# Altium footprint library VESC_MotorController.PcbLib: 78 footprints (part 5 of 5)
Each footprint in its own frame and in the unit in brackets; x right, y up, seen from the top. Pads: shape width x height; smd on the part's side, far side on the other; paste and mask are expansions set on the pad; w line width, h text height; cw(c..) or ccw(c..) is an arc to the next point about the centre after c.
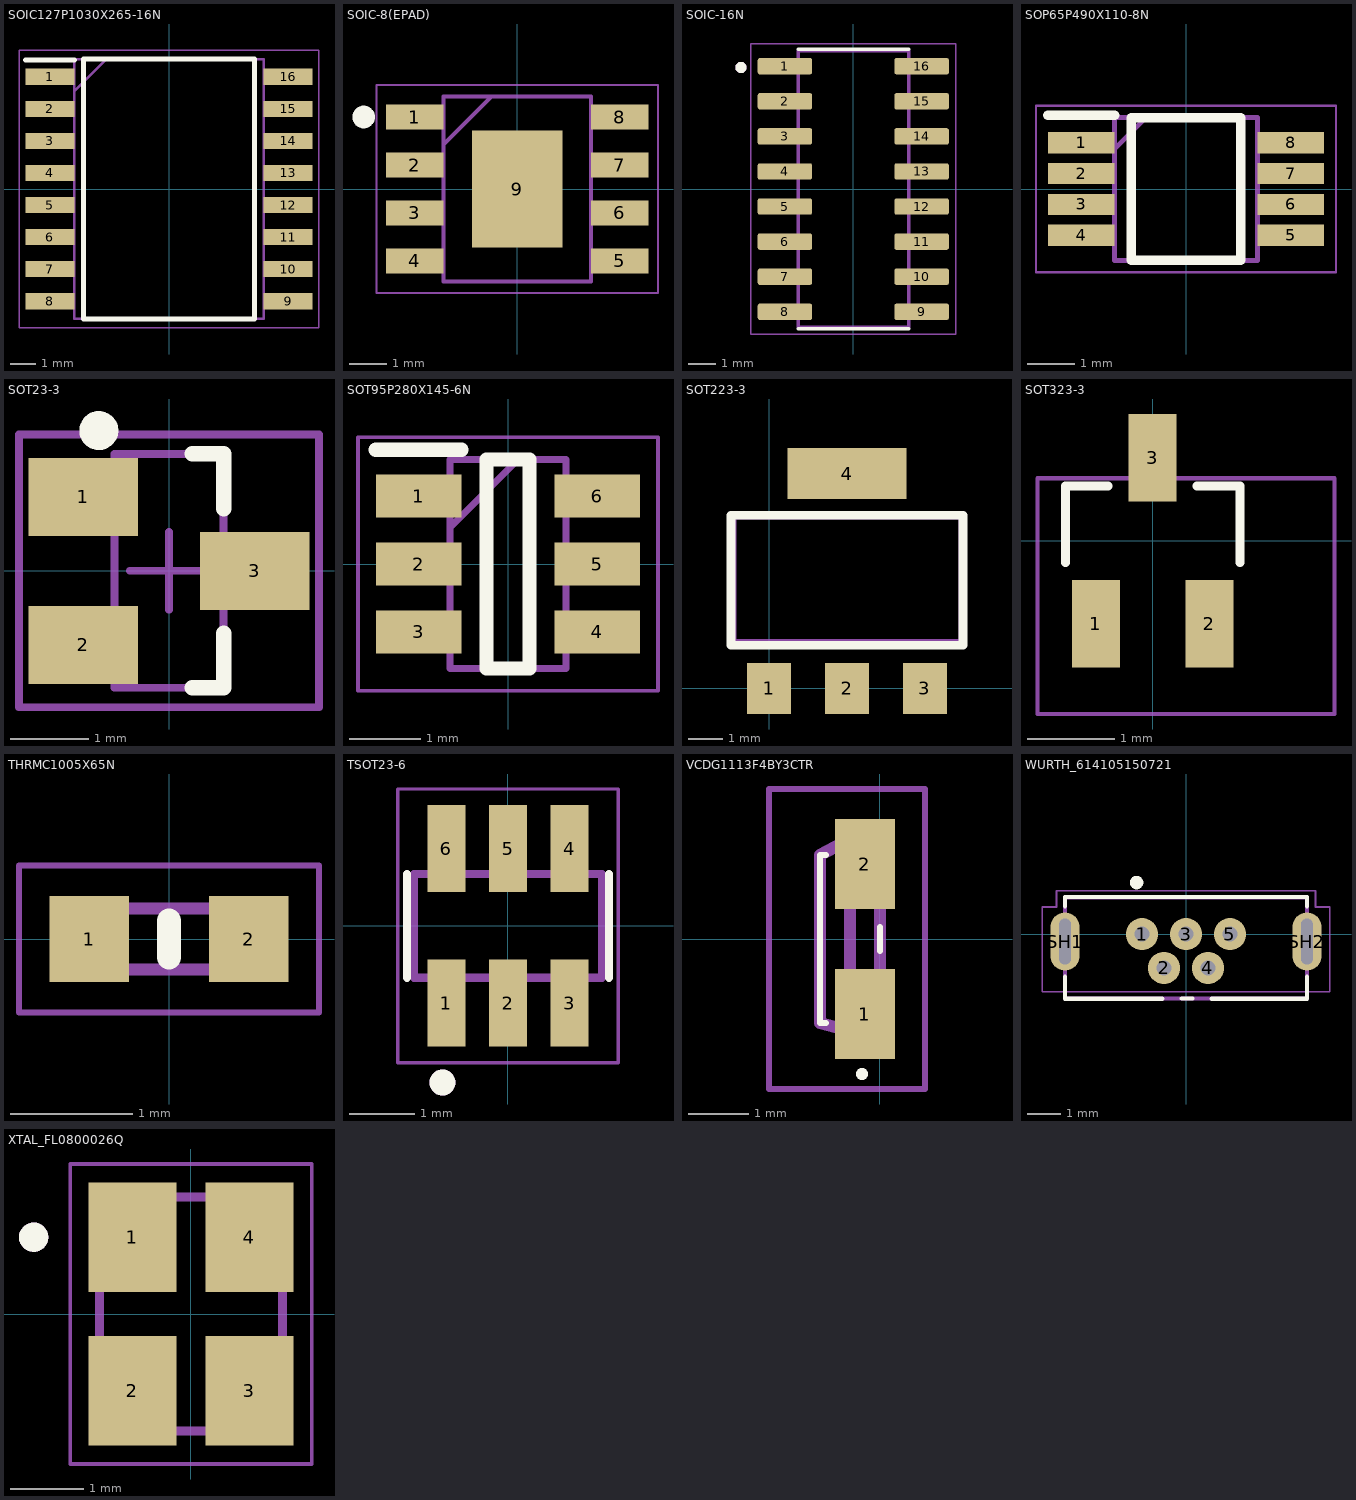
[diagram p4: the footprints below, top view; thin cyan lines are the x and y axes]

## SOIC127P1030X265-16N [mm]
pads (16):
  rect 1.95x0.65 smd: 1(-4.725,4.445) 2(-4.725,3.175) 3(-4.725,1.905) 4(-4.725,0.635) 5(-4.725,-0.635) 6(-4.725,-1.905) 7(-4.725,-3.175) 8(-4.725,-4.445) 9(4.725,-4.445) 10(4.725,-3.175) 11(4.725,-1.905) 12(4.725,-0.635) 13(4.725,0.635) 14(4.725,1.905) 15(4.725,3.175) 16(4.725,4.445)
Top Overlay:
  lines w0.2: -5.7,5.12 -3.75,5.12 ; -3.4,-5.15 3.4,-5.15 3.4,5.15 -3.4,5.15 -3.4,-5.15
Mechanical 15:
  lines w0.1: -3.75,3.88 -2.48,5.15 ; -3.75,-5.15 3.75,-5.15 3.75,5.15 -3.75,5.15 -3.75,-5.15
Mechanical 20:
  lines w0.05: -5.95,-5.5 5.95,-5.5 5.95,5.5 -5.95,5.5 -5.95,-5.5
3D body "UCC21520ADW.stp": height 2.59, standoff 0, extent -5.167,-5.15 5.167,5.15

## SOIC-8(EPAD) [mm]
height 17.75
pads (9):
  rect 1.525x0.65 smd: 1(-2.712,1.905) 2(-2.712,0.635) 3(-2.712,-0.635) 4(-2.712,-1.905) 5(2.712,-1.905) 6(2.712,-0.635) 7(2.712,0.635) 8(2.712,1.905)
  rect 2.4x3.1 smd: 9(0,0)
Top Overlay:
  circle w0.3: c-4.064,1.905 r0.15
Mechanical 15:
  lines w0.1: -1.95,1.18 -0.68,2.45 ; -1.95,-2.45 1.95,-2.45 1.95,2.45 -1.95,2.45 -1.95,-2.45
Mechanical 16:
  lines w0.05: -3.725,-2.75 3.725,-2.75 3.725,2.75 -3.725,2.75 -3.725,-2.75
3D body "LM5164DDAR.stp": height 1.57, standoff 0, extent -3,-2.45 3,2.45

## SOIC-16N [mm]
pads (16):
  rrect25% 1.97x0.59 smd: 1(-2.475,4.445) 2(-2.475,3.175) 3(-2.475,1.905) 4(-2.475,0.635) 5(-2.475,-0.635) 6(-2.475,-1.905) 7(-2.475,-3.175) 8(-2.475,-4.445) 9(2.475,-4.445) 10(2.475,-3.175) 11(2.475,-1.905) 12(2.475,-0.635) 13(2.475,0.635) 14(2.475,1.905) 15(2.475,3.175) 16(2.475,4.445)
Top Overlay:
  circle w0.2: c-4.064,4.4 r0.1
  lines w0.127: -2,-5.06 2,-5.06 ; -2,5.06 2,5.06
Mechanical 13:
  circle w0.2: c-4.064,4.4 r0.1
  lines w0.127: -2,-5 -2,5 2,5 2,-5 -2,-5
Mechanical 15:
  lines w0.05: -3.71,-5.25 -3.71,5.25 3.71,5.25 3.71,-5.25 -3.71,-5.25
3D body "STGAP2DMTR.STEP": height 1.75, standoff 0, extent -3,-4.95 3,4.95

## SON65P300X300X80-9N [mm]
3D body "NTMTSC002N10MCTXG.stp": height 1.02, standoff 0, extent -4.15,-4.2 4.15,4.2

## SOP65P490X110-8N [mm]
pads (8):
  rect 1.4x0.45 smd: 1(-2.2,0.975) 2(-2.2,0.325) 3(-2.2,-0.325) 4(-2.2,-0.975) 5(2.2,-0.975) 6(2.2,-0.325) 7(2.2,0.325) 8(2.2,0.975)
Top Overlay:
  lines w0.2: -2.9,1.55 -1.5,1.55 ; -1.15,-1.5 1.15,-1.5 1.15,1.5 -1.15,1.5 -1.15,-1.5
Mechanical 15:
  lines w0.1: -1.5,0.85 -0.85,1.5 ; -1.5,-1.5 1.5,-1.5 1.5,1.5 -1.5,1.5 -1.5,-1.5
Mechanical 20:
  lines w0.05: -3.15,-1.75 3.15,-1.75 3.15,1.75 -3.15,1.75 -3.15,-1.75
3D body "MCP16311T-E_MS.stp": height 1.1, standoff 0, extent -2.45,-1.5 2.45,1.5

## SOT23-3 [mm] "SOT23 semtech SM712"
height 1
pads (3):
  rect 1.4x1 smd: 1(-1.1,0.95) 2(-1.1,-0.95) 3(1.1,0)
Top Overlay:
  circle w0.25: c-0.9,1.8 r0.125
  lines w0.2: 0.3,-1.5 0.7,-1.5 0.7,-0.8 ; 0.3,1.5 0.7,1.5 0.7,0.8
Mechanical 13:
  lines w0.1: -0.7,-1.5 -0.7,1.5 0.7,1.5 0.7,-1.5 -0.7,-1.5
Mechanical 15:
  lines w0.1: -0.5,0 0.5,0 ; 0,-0.5 0,0.5 ; -1.925,-1.75 -1.925,1.75 1.925,1.75 1.925,-1.75 -1.925,-1.75
3D body: height 0.2, standoff 0, extent -1.422,0.711 -1.067,1.219
3D body: height 0.2, standoff 0, extent -1.473,-1.219 -1.067,-0.711
3D body: height 0.2, standoff 0, extent 1.067,-0.254 1.473,0.254
3D body: height 0.55, standoff 0, extent -1.067,0.711 -0.864,1.219
3D body: height 0.55, standoff 0, extent -1.067,-1.219 -0.864,-0.711
3D body: height 0.55, standoff 0, extent 0.864,-0.254 1.067,0.254
3D body: height 0.55, standoff 0.35, extent 0.66,-0.254 0.864,0.254
3D body: height 0.55, standoff 0.35, extent -0.864,-1.219 -0.66,-0.711
3D body: height 0.55, standoff 0.35, extent -0.864,0.711 -0.61,1.219
3D body: height 1.1, standoff 0.1, extent -0.7,-1.5 0.7,1.5

## SOT95P280X145-6N [mm]
pads (6):
  rect 1.2x0.6 smd: 1(-1.25,0.95) 2(-1.25,0) 3(-1.25,-0.95) 4(1.25,-0.95) 5(1.25,0) 6(1.25,0.95)
Top Overlay:
  lines w0.2: -1.85,1.6 -0.65,1.6 ; -0.3,-1.462 0.3,-1.462 0.3,1.462 -0.3,1.462 -0.3,-1.462
Mechanical 15:
  lines w0.1: -0.812,0.512 0.138,1.462 ; -0.812,-1.462 0.812,-1.462 0.812,1.462 -0.812,1.462 -0.812,-1.462
Mechanical 20:
  lines w0.05: -2.1,-1.775 2.1,-1.775 2.1,1.775 -2.1,1.775 -2.1,-1.775
3D body "USBLC6-2SC6Y.stp": height 1.45, standoff 0, extent -1.4,-1.462 1.4,1.462

## SOT223-3 [mm]
height 2
pads (4):
  rect 1.3x1.5 smd: 1(0,0) 2(2.286,0) 3(4.572,0)
  rect 3.5x1.5 smd: 4(2.286,6.299)
Top Overlay:
  lines w0.254: -1.116,1.27 5.688,1.27 5.688,5.08 -1.116,5.08 -1.116,1.27
Mechanical 1:
  lines w0.2: -1.05,1.35 5.65,1.35 5.65,5.05 -1.05,5.05 -1.05,1.35
3D body "SW3dPS-sot-223.step": height 1.64, standoff -0.04, extent -1,-0.3 5.5,6.632

## SOT323-3 [mm]
pads (3):
  rect 0.55x1 smd: 1(-0.65,-0.95) 2(0.65,-0.95) 3(0,0.95)
Top Overlay:
  lines w0.1: -1,-0.254 -1,0.625 -0.508,0.625 ; 0.508,0.625 1,0.625 1,-0.254
Mechanical 20:
  lines w0.05: -1.319,-1.985 2.081,-1.985 2.081,0.715 -1.319,0.715 -1.319,-1.985
3D body "BSS138PW,115.stp": height 0.93, standoff -0.02, extent -1.084,-1.05 1.016,1.05

## THRMC1005X65N [mm]
pads (2):
  rect 0.65x0.7 smd: 1(-0.65,0) 2(0.65,0)
Top Overlay:
  lines w0.2: 0,-0.15 0,0.15
Mechanical 15:
  lines w0.1: -0.5,-0.25 -0.5,0.25 0.5,0.25 0.5,-0.25 -0.5,-0.25
Mechanical 20:
  lines w0.05: -1.225,-0.6 -1.225,0.6 1.225,0.6 1.225,-0.6 -1.225,-0.6
3D body "NTCS0402E3103GL1T.stp": height 0.65, standoff 0, extent -0.5,-0.25 0.5,0.25

## TSOT23-6 [mm] "SOT23 semtech SM712"
height 1
pads (6):
  rect 0.59x1.34 smd: 1(-0.95,-1.19) 2(0,-1.19) 3(0.95,-1.19) 4(0.95,1.19) 5(0,1.19) 6(-0.95,1.19)
Top Overlay:
  circle w0.2: c-1.011,-2.416 r0.1
  lines w0.127: -1.558,-0.8 -1.558,0.8 ; 1.559,-0.8 1.559,0.8
Mechanical 13:
  circle w0.2: c-1.011,-2.416 r0.1
  lines w0.127: -1.45,-0.8 -1.45,0.8 1.45,0.8 1.45,-0.8 -1.45,-0.8
Mechanical 15:
  lines w0.05: -1.7,-2.11 -1.7,2.11 1.7,2.11 1.7,-2.11 -1.7,-2.11
3D body "step_temp.STEP": height 1, standoff 0, extent -1.45,-1.4 1.45,1.4

## VCDG1113F4BY3CTR [mm]
pads (2):
  rect 1x1.5 smd: 1(-0.25,-1.25) 2(-0.25,1.25)
Top Overlay:
  lines w0.1: -0.9,-1.4 -1,-1.4 -1,1.4 -0.9,1.4 ; 0,-0.2 0,0.2 ; -0.3,-2.3 ccw(c-0.3,-2.25) -0.3,-2.2 ccw(c-0.3,-2.25) -0.3,-2.3
Mechanical 15:
  lines w0.2: -0.25,-1.6 -1,-1.4 -1,1.4 -0.25,1.8 ; -0.5,-1.05 -0.5,1.05 0,1.05 0,-1.05 -0.5,-1.05 ; -0.5,-0.85 -0.5,0.85 -0.5,-0.85
Mechanical 20:
  lines w0.1: -1.85,-2.5 -1.85,2.5 0.75,2.5 0.75,-2.5 -1.85,-2.5
3D body "VCDG1113F-4BY3C-TR.stp": height 0.95, standoff -0.05, extent -0.6,-1.05 0,1.05

## WURTH_614105150721 [mm]
pads (7):
  round 0.948 hole 0.44: 1(-1.3,0) 2(-0.65,-1) 3(0,0) 4(0.65,-1) 5(1.3,0)
  oval 0.858x1.716 hole 0.35 slot 1.35 at 90 deg: SH1(-3.575,-0.22) SH2(3.575,-0.22)
Top Overlay:
  circle w0.2: c-1.46,1.524 r0.1
  lines w0.127: -3.575,-1.26 -3.575,-1.911 -0.699,-1.911 ; -3.575,0.82 -3.575,1.095 3.575,1.095 3.575,0.82 ; -0.127,-1.905 0.193,-1.905 ; 0.762,-1.912 3.575,-1.912 3.575,-1.26
Mechanical 13:
  circle w0.2: c-1.3,0 r0.1
  lines w0.127: -3.575,-1.905 -3.575,1.079 3.575,1.079 3.575,-1.905 -3.575,-1.905
Mechanical 15:
  lines w0.05: -4.25,-1.7 4.25,-1.7 4.25,0.8 3.825,0.8 3.825,1.28 -3.825,1.28 -3.825,0.8 -4.25,0.8 -4.25,-1.7
3D body "614105150621.stp": height 5.56, standoff -1.55, extent -4,-1.904 4,1.078

## XTAL_FL0800026Q [mm]
height 0.78
pads (4):
  rect 1.2x1.5 smd: 1(-0.8,1.05) 2(-0.8,-1.05) 3(0.8,-1.05) 4(0.8,1.05)
Top Overlay:
  circle w0.2: c-2.15,1.05 r0.1
Mechanical 13:
  circle w0.2: c-2.15,1.05 r0.1
  lines w0.127: -1.25,-1.6 -1.25,1.6 1.25,1.6 1.25,-1.6 -1.25,-1.6
Mechanical 15:
  lines w0.05: -1.65,-2.05 -1.65,2.05 1.65,2.05 1.65,-2.05 -1.65,-2.05
3D body "step_temp.STEP": height 0.78, standoff 0, extent -1.25,-1.6 1.25,1.6